# Altium footprint library Reflow3D1411sep.PcbLib: 657 footprints (part 4 of 42)
Each footprint in its own frame and in the unit in brackets; x right, y up, seen from the top. Pads: shape width x height; smd on the part's side, far side on the other; paste and mask are expansions set on the pad; w line width, h text height; cw(c..) or ccw(c..) is an arc to the next point about the centre after c.
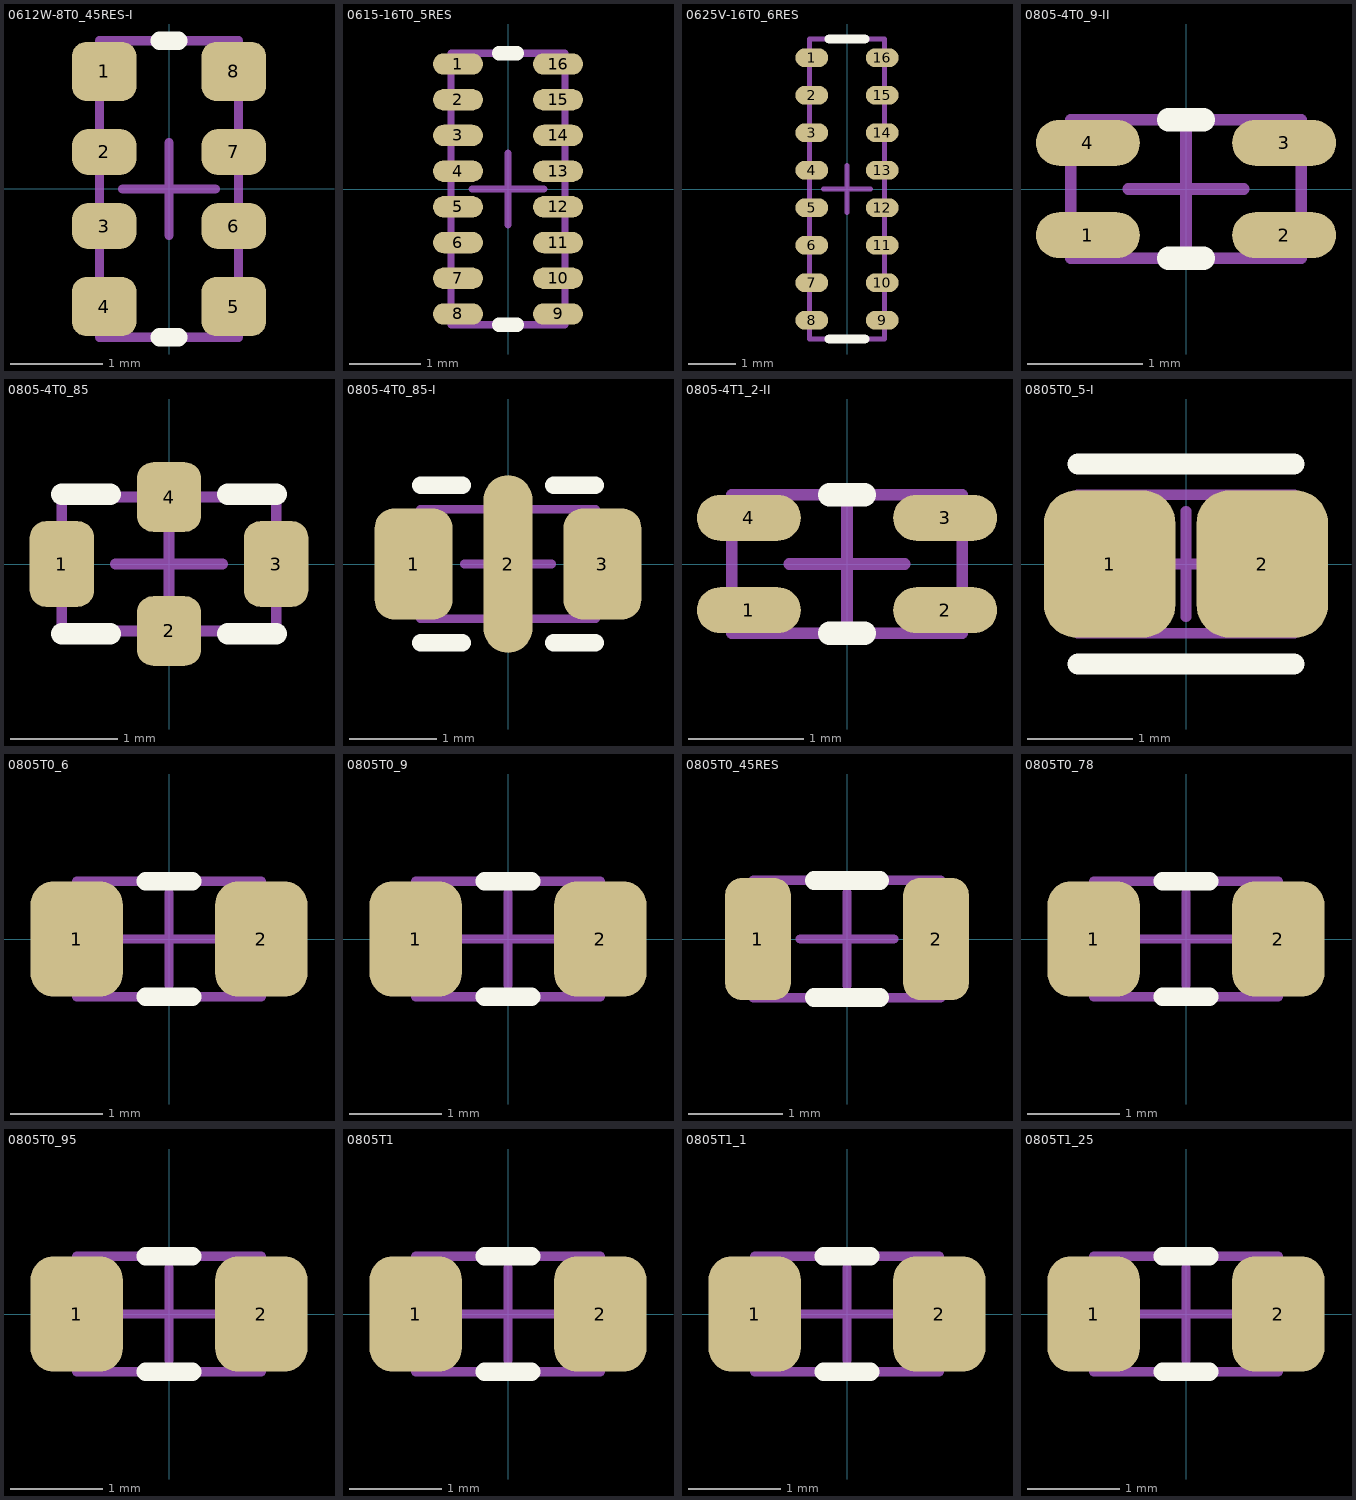
[diagram p3: the footprints below, top view; thin cyan lines are the x and y axes]

## 0612W-8T0_45RES-I [mm] "www.vishay.com, acasat.pdf, ACAS 0612"
height 0.45
pads (8):
  rrect50% 0.7x0.64 smd mask+0.075: 1(-0.7,1.27) 4(-0.7,-1.27) 5(0.7,-1.27) 8(0.7,1.27)
  rrect75% 0.7x0.5 smd mask+0.075: 2(-0.7,0.4) 3(-0.7,-0.4) 6(0.7,-0.4) 7(0.7,0.4)
Top Overlay:
  lines w0.2: -0.1,-1.6 0.1,-1.6 ; -0.1,1.6 0.1,1.6
Mechanical 13:
  lines w0.1: -0.75,-1.6 0.75,-1.6 0.75,1.6 -0.75,1.6 -0.75,-1.6
Mechanical 15:
  lines w0.1: -0.5,0 0.5,0 ; 0,-0.5 0,0.5
3D body: height 0.55, standoff 0, extent -0.825,-1.675 0.825,1.675

## 0615-16T0_5RES [mm] "www.bourns.com, CATCAY.pdf, CAY16-J8"
height 0.5
pads (16):
  oval 0.7x0.3 smd mask+0.05: 1(-0.7,1.75) 2(-0.7,1.25) 3(-0.7,0.75) 4(-0.7,0.25) 5(-0.7,-0.25) 6(-0.7,-0.75) 7(-0.7,-1.25) 8(-0.7,-1.75) 9(0.7,-1.75) 10(0.7,-1.25) 11(0.7,-0.75) 12(0.7,-0.25) 13(0.7,0.25) 14(0.7,0.75) 15(0.7,1.25) 16(0.7,1.75)
Top Overlay:
  lines w0.2: -0.125,-1.9 0.125,-1.9 ; -0.125,1.9 0.125,1.9
Mechanical 13:
  lines w0.1: -0.8,-1.9 0.8,-1.9 0.8,1.9 -0.8,1.9 -0.8,-1.9
Mechanical 15:
  lines w0.1: -0.5,0 0.5,0 ; 0,-0.5 0,0.5
3D body: height 0.6, standoff 0, extent -0.9,-2 0.9,2

## 0625V-16T0_6RES [mm] "www.bourns.com, CAT16LV4F12.pdf"
height 0.6
pads (16):
  oval 0.7x0.4 smd mask+0.075: 1(-0.75,2.8) 2(-0.75,2) 3(-0.75,1.2) 4(-0.75,0.4) 5(-0.75,-0.4) 6(-0.75,-1.2) 7(-0.75,-2) 8(-0.75,-2.8) 9(0.75,-2.8) 10(0.75,-2) 11(0.75,-1.2) 12(0.75,-0.4) 13(0.75,0.4) 14(0.75,1.2) 15(0.75,2) 16(0.75,2.8)
Top Overlay:
  lines w0.2: -0.375,-3.2 0.375,-3.2 ; -0.375,3.2 0.375,3.2
Mechanical 13:
  lines w0.1: -0.8,-3.2 0.8,-3.2 0.8,3.2 -0.8,3.2 -0.8,-3.2
Mechanical 15:
  lines w0.1: -0.5,0 0.5,0 ; 0,-0.5 0,0.5
3D body: height 0.7, standoff 0, extent -0.875,-3.275 0.875,3.275

## 0805-4T0_9-II [mm] "www.murata.com, c31e.pdf, DLW21H"
height 0.9
pads (4):
  oval 0.9x0.4 smd paste-25.4 mask+0.075: 1(-0.85,-0.4) 2(0.85,-0.4) 3(0.85,0.4) 4(-0.85,0.4)
Top Overlay:
  lines w0.2: -0.15,-0.6 0.15,-0.6 ; -0.15,0.6 0.15,0.6
Top Paste:
  region: -0.4,-0.6 -0.4,-0.25 -1.3,-0.25 -1.3,-0.6
  region: -0.4,0.25 -0.4,0.6 -1.3,0.6 -1.3,0.25
  region: 1.3,0.25 1.3,0.6 0.4,0.6 0.4,0.25
  region: 1.3,-0.6 1.3,-0.25 0.4,-0.25 0.4,-0.6
Mechanical 13:
  lines w0.1: -1,-0.6 1,-0.6 1,0.6 -1,0.6 -1,-0.6
Mechanical 15:
  lines w0.1: -0.5,0 0.5,0 ; 0,-0.5 0,0.5
3D body: height 1, standoff 0, extent -1.1,-0.7 1.1,0.7

## 0805-4T0_85 [mm] "www.murata.com, c31e.pdf, NFM21P"
height 0.85
pads (4):
  rrect50% 0.6x0.8 smd mask+0.075: 1(-1,0) 3(1,0)
  rrect50% 0.6x0.65 smd mask+0.075: 2(0,-0.625) 4(0,0.625)
Top Overlay:
  lines w0.2: -1,-0.65 -0.55,-0.65 ; -1,0.65 -0.55,0.65 ; 0.55,-0.65 1,-0.65 ; 0.55,0.65 1,0.65
Mechanical 13:
  lines w0.1: -1,-0.625 -1,0.625 1,0.625 1,-0.625 -1,-0.625
Mechanical 15:
  lines w0.1: -0.5,0 0.5,0 ; 0,-0.5 0,0.5
3D body: height 0.95, standoff 0, extent -1.1,-0.675 1.1,0.675

## 0805-4T0_85-I [mm] "www.yageo.com, X2Y_series_13.pdf"
height 0.85
pads (3):
  rrect50% 0.89x1.27 smd mask+0.075: 1(-1.08,0) 3(1.08,0)
  oval 0.56x2.03 smd mask+0.075: 2(0,0)
Top Overlay:
  lines w0.2: -1,-0.9 -0.525,-0.9 ; -1,0.9 -0.525,0.9 ; 0.525,-0.9 1,-0.9 ; 0.525,0.9 1,0.9
Mechanical 13:
  lines w0.1: -1,-0.625 -1,0.625 1,0.625 1,-0.625 -1,-0.625
Mechanical 15:
  lines w0.1: -0.5,0 0.5,0 ; 0,-0.5 0,0.5
3D body: height 0.95, standoff 0, extent -1.075,-0.7 1.075,0.7

## 0805-4T1_2-II [mm] "www.murata.com, c31e.pdf, DLW21S"
height 1.2
pads (4):
  oval 0.9x0.4 smd paste-25.4 mask+0.075: 1(-0.85,-0.4) 2(0.85,-0.4) 3(0.85,0.4) 4(-0.85,0.4)
Top Overlay:
  lines w0.2: -0.15,-0.6 0.15,-0.6 ; -0.15,0.6 0.15,0.6
Top Paste:
  region: -0.4,-0.6 -0.4,-0.25 -1.3,-0.25 -1.3,-0.6
  region: -0.4,0.25 -0.4,0.6 -1.3,0.6 -1.3,0.25
  region: 1.3,0.25 1.3,0.6 0.4,0.6 0.4,0.25
  region: 1.3,-0.6 1.3,-0.25 0.4,-0.25 0.4,-0.6
Mechanical 13:
  lines w0.1: -1,-0.6 -1,0.6 1,0.6 1,-0.6 -1,-0.6
Mechanical 15:
  lines w0.1: -0.5,0 0.5,0 ; 0,-0.5 0,0.5
3D body: height 1.4, standoff 0, extent -1.1,-0.7 1.1,0.7

## 0805T0_5-I [mm] "www.avx.com, smccp.pdf, LGC2"
height 0.5
pads (2):
  rrect50% 1.25x1.4 smd mask+0.05: 1(-0.725,0) 2(0.725,0)
Top Overlay:
  lines w0.2: -1.025,-0.95 1.025,-0.95 ; -1.025,0.95 1.025,0.95
Mechanical 13:
  lines w0.1: -1.03,-0.66 -1.03,0.66 1.03,0.66 1.03,-0.66 -1.03,-0.66
Mechanical 15:
  lines w0.1: -0.5,0 0.5,0 ; 0,-0.5 0,0.5
3D body: height 0.55, standoff 0, extent -1.08,-0.71 1.08,0.71

## 0805T0_6 [mm] "www.avx.com, smccp.pdf; www.kemet.com, F3102_C0G.pdf"
height 0.6
pads (2):
  rrect50% 1x1.25 smd mask+0.075: 1(-1,0) 2(1,0)
Top Overlay:
  lines w0.2: -0.25,-0.625 0.25,-0.625 ; -0.25,0.625 0.25,0.625
Mechanical 13:
  lines w0.1: -1,-0.625 -1,0.625 1,0.625 1,-0.625 -1,-0.625
Mechanical 15:
  lines w0.1: -0.5,0 0.5,0 ; 0,-0.5 0,0.5
3D body: height 0.7, standoff 0, extent -1.1,-0.725 1.1,0.725

## 0805T0_9 [mm] "www.avx.com, smccp.pdf; www.kemet.com, F3102_C0G.pdf"
height 0.9
pads (2):
  rrect50% 1x1.25 smd mask+0.075: 1(-1,0) 2(1,0)
Top Overlay:
  lines w0.2: -0.25,-0.625 0.25,-0.625 ; -0.25,0.625 0.25,0.625
Mechanical 13:
  lines w0.1: -1,-0.625 1,-0.625 1,0.625 -1,0.625 -1,-0.625
Mechanical 15:
  lines w0.1: -0.5,0 0.5,0 ; 0,-0.5 0,0.5
3D body: height 1, standoff 0, extent -1.1,-0.725 1.1,0.725

## 0805T0_45RES [mm] "www.vishay.com, dcrcwe3.pdf"
height 0.45
pads (2):
  rrect50% 0.7x1.3 smd mask+0.075: 1(-0.95,0) 2(0.95,0)
Top Overlay:
  lines w0.2: -0.35,-0.625 0.35,-0.625 ; -0.35,0.625 0.35,0.625
Mechanical 13:
  lines w0.1: -1,-0.625 1,-0.625 1,0.625 -1,0.625 -1,-0.625
Mechanical 15:
  lines w0.1: -0.5,0 0.5,0 ; 0,-0.5 0,0.5
3D body: height 0.5, standoff 0, extent -1.1,-0.7 1.1,0.7

## 0805T0_78 [mm] "www.avx.com, smccp.pdf; www.kemet.com, F3102_C0G.pdf"
height 0.78
pads (2):
  rrect50% 1x1.25 smd mask+0.075: 1(-1,0) 2(1,0)
Top Overlay:
  lines w0.2: -0.25,-0.625 0.25,-0.625 ; -0.25,0.625 0.25,0.625
Mechanical 13:
  lines w0.1: -1,-0.625 -1,0.625 1,0.625 1,-0.625 -1,-0.625
Mechanical 15:
  lines w0.1: -0.5,0 0.5,0 ; 0,-0.5 0,0.5
3D body: height 0.88, standoff 0, extent -1.1,-0.725 1.1,0.725

## 0805T0_95 [mm] "www.avx.com, smccp.pdf; www.kemet.com, F3102_C0G.pdf"
height 0.95
pads (2):
  rrect50% 1x1.25 smd mask+0.075: 1(-1,0) 2(1,0)
Top Overlay:
  lines w0.2: -0.25,-0.625 0.25,-0.625 ; -0.25,0.625 0.25,0.625
Mechanical 13:
  lines w0.1: -1,-0.625 -1,0.625 1,0.625 1,-0.625 -1,-0.625
Mechanical 15:
  lines w0.1: -0.5,0 0.5,0 ; 0,-0.5 0,0.5
3D body: height 1.05, standoff 0, extent -1.1,-0.725 1.1,0.725

## 0805T1 [mm] "www.avx.com, smccp.pdf; www.kemet.com, F3102_C0G.pdf"
height 1
pads (2):
  rrect50% 1x1.25 smd mask+0.075: 1(-1,0) 2(1,0)
Top Overlay:
  lines w0.2: -0.25,-0.625 0.25,-0.625 ; -0.25,0.625 0.25,0.625
Mechanical 13:
  lines w0.1: -1,-0.625 -1,0.625 1,0.625 1,-0.625 -1,-0.625
Mechanical 15:
  lines w0.1: -0.5,0 0.5,0 ; 0,-0.5 0,0.5
3D body: height 1.1, standoff 0, extent -1.1,-0.725 1.1,0.725

## 0805T1_1 [mm] "www.avx.com, smccp.pdf; www.kemet.com, F3102_C0G.pdf"
height 1.1
pads (2):
  rrect50% 1x1.25 smd mask+0.075: 1(-1,0) 2(1,0)
Top Overlay:
  lines w0.2: -0.25,-0.625 0.25,-0.625 ; -0.25,0.625 0.25,0.625
Mechanical 13:
  lines w0.1: -1,-0.625 1,-0.625 1,0.625 -1,0.625 -1,-0.625
Mechanical 15:
  lines w0.1: -0.5,0 0.5,0 ; 0,-0.5 0,0.5
3D body: height 1.2, standoff 0, extent -1.1,-0.725 1.1,0.725

## 0805T1_25 [mm] "www.avx.com, smccp.pdf; www.kemet.com, F3102_C0G.pdf"
height 1.25
pads (2):
  rrect50% 1x1.25 smd mask+0.075: 1(-1,0) 2(1,0)
Top Overlay:
  lines w0.2: -0.25,-0.625 0.25,-0.625 ; -0.25,0.625 0.25,0.625
Mechanical 13:
  lines w0.1: -1,-0.625 -1,0.625 1,0.625 1,-0.625 -1,-0.625
Mechanical 15:
  lines w0.1: -0.5,0 0.5,0 ; 0,-0.5 0,0.5
3D body: height 1.45, standoff 0, extent -1.1,-0.725 1.1,0.725